# Altium footprint library My Library.PcbLib: 872 footprints (part 34 of 55)
Each footprint in its own frame and in the unit in brackets; x right, y up, seen from the top. Pads: shape width x height; smd on the part's side, far side on the other; paste and mask are expansions set on the pad; w line width, h text height; cw(c..) or ccw(c..) is an arc to the next point about the centre after c.
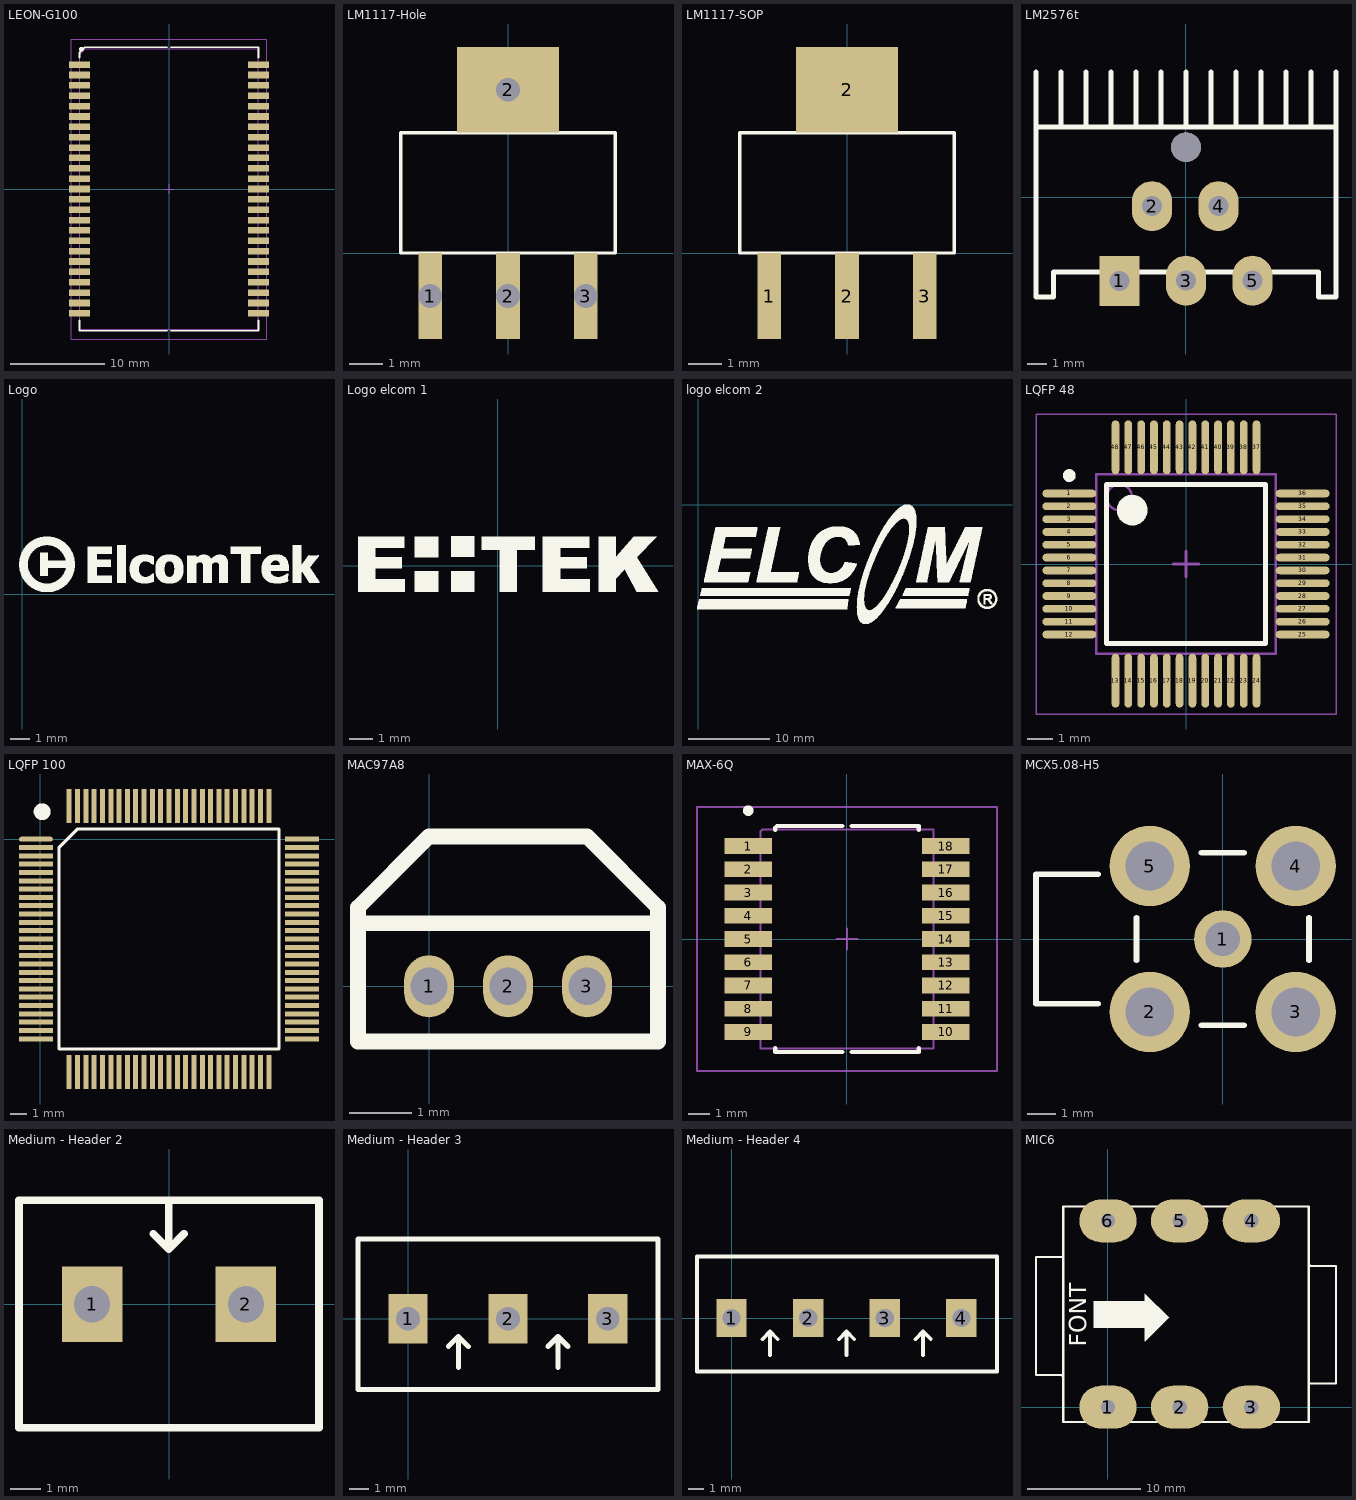
[diagram p33: the footprints below, top view; thin cyan lines are the x and y axes]

## LEON-G100 [mm] "LCC, 50-Pins, Body 19,0x30,1mm (max), Pitch 1,10mm, IPC Medium Density"
height 3
pads (50):
  rect 2.2x0.7 smd: 1(-9.5,13.2) 2(-9.5,12.1) 3(-9.5,11) 4(-9.5,9.9) 5(-9.5,8.8) 6(-9.5,7.7) 7(-9.5,6.6) 8(-9.5,5.5) 9(-9.5,4.4) 10(-9.5,3.3) 11(-9.5,2.2) 12(-9.5,1.1) 13(-9.5,0) 14(-9.5,-1.1) 15(-9.5,-2.2) 16(-9.5,-3.3) 17(-9.5,-4.4) 18(-9.5,-5.5) 19(-9.5,-6.6) 20(-9.5,-7.7) 21(-9.5,-8.8) 22(-9.5,-9.9) 23(-9.5,-11) 24(-9.5,-12.1) 25(-9.5,-13.2) 26(9.5,-13.2) 27(9.5,-12.1) 28(9.5,-11) 29(9.5,-9.9) 30(9.5,-8.8) 31(9.5,-7.7) 32(9.5,-6.6) 33(9.5,-5.5) 34(9.5,-4.4) 35(9.5,-3.3) 36(9.5,-2.2) 37(9.5,-1.1) 38(9.5,0) 39(9.5,1.1) 40(9.5,2.2) 41(9.5,3.3) 42(9.5,4.4) 43(9.5,5.5) 44(9.5,6.6) 45(9.5,7.7) 46(9.5,8.8) 47(9.5,9.9) 48(9.5,11) 49(9.5,12.1) 50(9.5,13.2)
Top Overlay:
  circle w0.25: c-9.3,14.85 r0.125
  lines w0.2: -9.5,-13.95 -9.5,-15.05 -0.2,-15.05 ; -9.5,13.95 -9.5,14.5 -8.95,15.05 -0.2,15.05 ; 0.2,-15.05 9.5,-15.05 9.5,-13.95 ; 0.2,15.05 9.5,15.05 9.5,13.95
Mechanical 13:
  lines w0.1: -9.45,-14.875 -9.45,14.325 -8.9,14.875 9.45,14.875 9.45,-14.875 -9.45,-14.875
Mechanical 15:
  lines w0.1: -0.5,0 0.5,0 ; 0,-0.5 0,0.5 ; -10.4,-15.925 -10.4,15.925 10.4,15.925 10.4,-15.925 -10.4,-15.925
3D body: height 3, standoff 0, extent -9.45,-14.875 9.45,14.875

## LM1117-Hole [mm]
pads (4):
  rect 0.7x2.54 hole 0.7: 1(-2.3,-1.27) 2(0,-1.27) 3(2.3,-1.27)
  rect 3x2.54 hole 0.7: 2(0,4.826)
Top Overlay:
  lines w0.1: -3.175,0 3.175,0 3.175,3.556 -3.175,3.556 -3.175,0
3D body "SW3DPS-SOT-223-DEFAULT.step": height 1.68, standoff 0, extent -3.25,-1.702 3.25,5.258

## LM1117-SOP [mm]
pads (4):
  rect 0.7x2.54 smd: 1(-2.3,-1.27) 2(0,-1.27) 3(2.3,-1.27)
  rect 3x2.54 smd: 2(0,4.826)
Top Overlay:
  lines w0.1: -3.175,0 -3.175,3.556 3.175,3.556 3.175,0 -3.175,0
3D body "SW3DPS-SOT-223-DEFAULT.step": height 1.68, standoff 0, extent -3.25,-1.778 3.25,5.182

## LM2576t [mil]
pads (6):
  rect 80x100 hole 40: 1(-132,-167.09)
  oval 80x100 hole 40: 2(-67,-18) 3(1,-167) 4(66,-18) 5(134,-167)
  round 59.06 hole 59.06: ""(1,100)
Top Overlay:
  lines w10: -299,140 301,140 ; -299,250 -299,-200 -264,-200 -264,-150 266,-150 266,-200 301,-200 301,250 ; -249,140 -249,250 ; -199,140 -199,250 ; -149,140 -149,250 ; -99,140 -99,250 ; -49,140 -49,250 ; 1,140 1,250 ; 51,140 51,250 ; 101,140 101,250 ; 151,140 151,250 ; 201,140 201,250 ; 251,140 251,250
3D body "SW3dPS-TO220-5.STEP": height 859.05, standoff -85.43, extent -199,-174.91 201,149.5

## Logo [mm] "LogoElcomTek"
Top Overlay:
  drawing of 942 lines, arcs and shapes, not listed

## Logo elcom 1 [mm]
Top Overlay:
  region: 4.318,1.245 4.318,-1.118 5.055,-1.118 5.055,-0.559 5.436,-0.152 5.944,-1.118 6.858,-1.118 5.944,0.356 6.807,1.245 5.817,1.245 5.055,0.356 5.055,1.245
  region: 3.937,-1.118 3.937,-0.584 2.667,-0.584 2.667,-0.102 3.81,-0.102 3.81,0.356 2.667,0.356 2.667,0.762 3.912,0.762 3.912,1.245 1.93,1.245 1.93,-1.118
  region: -0.686,0.686 -0.686,1.245 1.575,1.245 1.575,0.686 0.813,0.686 0.813,-1.118 0.076,-1.118 0.076,0.686
  region: -3.556,-0.229 -2.565,-0.229 -2.565,-1.118 -3.556,-1.118
  region: -2.007,-0.229 -1.016,-0.229 -1.016,-1.118 -2.007,-1.118
  region: -2.007,1.27 -1.016,1.27 -1.016,0.381 -2.007,0.381
  region: -3.556,1.245 -2.565,1.245 -2.565,0.356 -3.556,0.356
  region: -3.988,-1.118 -3.988,-0.584 -5.258,-0.584 -5.258,-0.102 -4.115,-0.102 -4.115,0.356 -5.258,0.356 -5.258,0.762 -4.013,0.762 -4.013,1.245 -5.994,1.245 -5.994,-1.118

## logo elcom 2 [mm]
height 2.54
Top Overlay:
  drawing of 3192 lines, arcs and shapes, not listed

## LQFP 48 [mm] "LQFP, 48-Leads, Body 7,00x7,00mm, Pitch 0,50mm, IPC Medium Density"
height 1.6
pads (48):
  oval 2.1x0.3 smd: 1(-4.55,2.75) 2(-4.55,2.25) 3(-4.55,1.75) 4(-4.55,1.25) 5(-4.55,0.75) 6(-4.55,0.25) 7(-4.55,-0.25) 8(-4.55,-0.75) 9(-4.55,-1.25) 10(-4.55,-1.75) 11(-4.55,-2.25) 12(-4.55,-2.75) 25(4.55,-2.75) 26(4.55,-2.25) 27(4.55,-1.75) 28(4.55,-1.25) 29(4.55,-0.75) 30(4.55,-0.25) 31(4.55,0.25) 32(4.55,0.75) 33(4.55,1.25) 34(4.55,1.75) 35(4.55,2.25) 36(4.55,2.75)
  oval 0.3x2.1 smd: 13(-2.75,-4.55) 14(-2.25,-4.55) 15(-1.75,-4.55) 16(-1.25,-4.55) 17(-0.75,-4.55) 18(-0.25,-4.55) 19(0.25,-4.55) 20(0.75,-4.55) 21(1.25,-4.55) 22(1.75,-4.55) 23(2.25,-4.55) 24(2.75,-4.55) 37(2.75,4.55) 38(2.25,4.55) 39(1.75,4.55) 40(1.25,4.55) 41(0.75,4.55) 42(0.25,4.55) 43(-0.25,4.55) 44(-0.75,4.55) 45(-1.25,4.55) 46(-1.75,4.55) 47(-2.25,4.55) 48(-2.75,4.55)
Top Overlay:
  circle w0.6: c-2.1,2.1 r0.3
  circle w0.25: c-4.55,3.45 r0.125
  lines w0.2: -3.1,-3.1 3.1,-3.1 3.1,3.1 -3.1,3.1 -3.1,-3.1
Mechanical 13:
  circle w0.1: c-2.6,2.6 r0.5
  lines w0.1: -3.5,-3.5 3.5,-3.5 3.5,3.5 -3.5,3.5 -3.5,-3.5
Mechanical 15:
  lines w0.05: -5.85,-5.85 5.85,-5.85 5.85,5.85 -5.85,5.85 -5.85,-5.85
  lines w0.1: -0.5,0 0.5,0 ; 0,-0.5 0,0.5
3D body "LQFP 48.step": height 1.6, standoff 0, extent -4.5,-4.5 4.5,4.5

## LQFP 100 [mm]
pads (100):
  oval 2.032x0.3 smd: 1(-0.25,0)
  rect 2.032x0.3 smd: 2(-0.25,-0.5) 3(-0.25,-1) 4(-0.25,-1.5) 5(-0.25,-2) 6(-0.25,-2.5) 7(-0.25,-3) 8(-0.25,-3.5) 9(-0.25,-4) 10(-0.25,-4.5) 11(-0.25,-5) 12(-0.25,-5.5) 13(-0.25,-6) 14(-0.25,-6.5) 15(-0.25,-7) 16(-0.25,-7.5) 17(-0.25,-8) 18(-0.25,-8.5) 19(-0.25,-9) 20(-0.25,-9.5) 21(-0.25,-10) 22(-0.25,-10.5) 23(-0.25,-11) 24(-0.25,-11.5) 25(-0.25,-12) 51(15.75,-12) 52(15.75,-11.5) 53(15.75,-11) 54(15.75,-10.5) 55(15.75,-10) 56(15.75,-9.5) 57(15.75,-9) 58(15.75,-8.5) 59(15.75,-8) 60(15.75,-7.5) 61(15.75,-7) 62(15.75,-6.5) 63(15.75,-6) 64(15.75,-5.5) 65(15.75,-5) 66(15.75,-4.5) 67(15.75,-4) 68(15.75,-3.5) 69(15.75,-3) 70(15.75,-2.5) 71(15.75,-2) 72(15.75,-1.5) 73(15.75,-1) 74(15.75,-0.5) 75(15.75,0)
  rect 0.3x2.032 smd: 26(1.75,-14) 27(2.25,-14) 28(2.75,-14) 29(3.25,-14) 30(3.75,-14) 31(4.25,-14) 32(4.75,-14) 33(5.25,-14) 34(5.75,-14) 35(6.25,-14) 36(6.75,-14) 37(7.25,-14) 38(7.75,-14) 39(8.25,-14) 40(8.75,-14) 41(9.25,-14) 42(9.75,-14) 43(10.25,-14) 44(10.75,-14) 45(11.25,-14) 46(11.75,-14) 47(12.25,-14) 48(12.75,-14) 49(13.25,-14) 50(13.75,-14) 76(13.75,2) 77(13.25,2) 78(12.75,2) 79(12.25,2) 80(11.75,2) 81(11.25,2) 82(10.75,2) 83(10.25,2) 84(9.75,2) 85(9.25,2) 86(8.75,2) 87(8.25,2) 88(7.75,2) 89(7.25,2) 90(6.75,2) 91(6.25,2) 92(5.75,2) 93(5.25,2) 94(4.75,2) 95(4.25,2) 96(3.75,2) 97(3.25,2) 98(2.75,2) 99(2.25,2) 100(1.75,2)
Top Overlay:
  circle w0.508: c0.127,1.651 r0.254
  lines w0.2: 1.135,-12.615 14.365,-12.615 14.365,0.615 2.27,0.615 1.135,-0.52 1.135,-12.615
3D body "SW3dPS-LQFP100.STEP": height 1.6, standoff 0, extent -0.228,-13.994 15.772,2.006

## MAC97A8 [mm]
pads (3):
  oval 0.8x1 hole 0.6: 1(0,0) 2(1.27,0) 3(2.54,0)
Top Overlay:
  lines w0.254: -1.143,1.016 -1.143,-0.889 3.683,-0.889 3.683,1.016 ; -1.143,1.016 -1.143,1.27 0,2.413 2.54,2.413 3.683,1.27 3.683,1.016 ; -1.143,1.016 3.683,1.016

## MAX-6Q [mm] "LCC, 18-Pins, Body 6,8x10,7mm (max), Pitch 1,10mm, IPC Medium Density"
height 2.7
pads (18):
  rect 2.25x0.75 smd: 1(-4.675,4.4) 2(-4.675,3.3) 3(-4.675,2.2) 4(-4.675,1.1) 5(-4.675,0) 6(-4.675,-1.1) 7(-4.675,-2.2) 8(-4.675,-3.3) 9(-4.675,-4.4) 10(4.675,-4.4) 11(4.675,-3.3) 12(4.675,-2.2) 13(4.675,-1.1) 14(4.675,0) 15(4.675,1.1) 16(4.675,2.2) 17(4.675,3.3) 18(4.675,4.4)
Top Overlay:
  circle w0.25: c-4.675,6.075 r0.125
  lines w0.2: -3.4,-5.175 -3.4,-5.35 -0.225,-5.35 ; -3.4,5.175 -3.4,5.262 -3.313,5.35 -0.225,5.35 ; 0.225,-5.35 3.4,-5.35 3.4,-5.175 ; 0.225,5.35 3.4,5.35 3.4,5.175
Mechanical 13:
  lines w0.1: -4.1,-5.175 -4.1,5.088 -4.012,5.175 4.1,5.175 4.1,-5.175 -4.1,-5.175
Mechanical 15:
  lines w0.1: -0.5,0 0.5,0 ; 0,-0.5 0,0.5 ; -7.1,-6.25 -7.1,6.25 7.1,6.25 7.1,-6.25 -7.1,-6.25
3D body: height 2.7, standoff 0, extent -4.1,-5.175 4.1,5.175

## MCX5.08-H5 [mm] "Connector; RF Coaxial, MCX, Thru-Hole; 5 Position; Right-Angle"
height 5.85
pads (5):
  round 2 hole 1.2: 1(0,0)
  round 2.8 hole 1.7: 2(-2.54,-2.54) 3(2.54,-2.54) 4(2.54,2.54) 5(-2.54,2.54)
Top Overlay:
  lines w0.2: -4.34,-2.25 -6.5,-2.25 -6.5,2.25 -4.34,2.25 ; -3,-0.74 -3,0.74 ; -0.74,-3 0.74,-3 ; -0.74,3 0.74,3 ; 3,-0.74 3,0.74
3D body "User Library-919-119J-51AX.STEP": height 5.9, standoff -3.94, extent -6.5,-3 3,3

## Medium - Header 2 [mm]
pads (2):
  rect 2x2.5 hole 1.2: 1(-2.54,0) 2(2.54,0)
Top Overlay:
  lines w0.254: -0.521,2.324 -0.013,1.816 ; -0.013,3.378 -0.013,1.816 ; 0.495,2.324 -0.013,1.816 ; -4.953,-4.077 -4.953,3.429 4.953,3.429 4.953,-4.077 -4.953,-4.077
3D body "SW3DPS-HDR1x2-MED-GREEN.STEP": height 10, standoff -4, extent -5,-4.071 5,3.429

## Medium - Header 3 [mm]
pads (3):
  rect 2x2.5 hole 1.2: 1(0,0) 2(5.08,0) 3(10.147,0)
Top Overlay:
  lines w0.254: 2.045,-1.41 2.553,-0.902 ; 2.553,-2.464 2.553,-0.902 ; 3.061,-1.41 2.553,-0.902 ; 7.112,-1.41 7.62,-0.902 ; 7.62,-2.464 7.62,-0.902 ; 8.128,-1.41 7.62,-0.902 ; -2.54,-3.581 12.7,-3.581 12.7,4.064 -2.54,4.064 -2.54,-3.581
3D body "SW3DPS-HDR1x3-MED-GREEN.STEP": height 10, standoff -4, extent -2.42,-3.505 12.58,3.995

## Medium - Header 4 [mm]
pads (4):
  rect 2x2.5 hole 1.2: 1(0,0) 2(5.08,0) 3(10.147,0) 4(15.215,0)
Top Overlay:
  lines w0.254: 2.045,-1.41 2.553,-0.902 ; 2.553,-2.464 2.553,-0.902 ; 3.061,-1.41 2.553,-0.902 ; 7.112,-1.41 7.62,-0.902 ; 7.62,-2.464 7.62,-0.902 ; 8.128,-1.41 7.62,-0.902 ; 12.179,-1.41 12.687,-0.902 ; 12.687,-2.464 12.687,-0.902 ; 13.195,-1.41 12.687,-0.902 ; -2.286,-3.531 -2.286,4.064 17.577,4.064 17.577,-3.531 -2.286,-3.531
3D body "SW3DPS-HDR1x4-MED-GREEN.STEP": height 10, standoff -4, extent -2.362,-3.429 17.638,4.071

## MIC6 [mm] "Jac Mic 6 pin to"
pads (6):
  oval 5.08x3.81 hole 1.27: 1(0,0) 2(6.35,0) 3(12.7,0) 4(12.7,16.51) 5(6.35,16.51) 6(0,16.51)
Top Overlay:
  region: -1.27,9.373 -1.27,7.036 3.302,7.036 3.277,7.061 3.277,5.842 3.302,5.842 5.385,7.925 5.41,7.925 3.277,10.058 3.277,9.373
  lines w0.178: -3.962,-1.295 -3.962,17.755 ; -3.962,2.261 -3.962,13.335 -4.013,13.284 -6.375,13.284 -6.375,2.845 -4.115,2.845 -3.962,2.692 ; -3.962,17.78 17.78,17.78 17.78,14.986 ; -3.937,-1.321 -3.912,-1.295 -3.886,-1.321 17.78,-1.321 17.78,2.083 ; 17.78,12.675 17.932,12.522 20.193,12.522 20.193,2.083 17.831,2.083 17.78,2.032 17.78,15.088
  text "FONT" at -1.905,5.334 h1.52